# Altium schematic symbol library jlcpcb_2025_04_capacitors_extended_1206.schlib: 2503 symbols (part 12 of 14) (continued)
## HGC1206R5476M160NSPJ
designator C?  Capacitance: 47uF  (hidden comment: *)
Capacitor, Ceramic (MLCC), 47uF, ±20%, 16V, X5R, ±20%, SMD 1206; Manufacturer: Chinocera; Manufacturer Part Number: HGC1206R5476M160NSPJ; Package Size: 1206; JLCPCB Basic Part: No; JLCPCB Part Number: C7472975; Supplier 1: LCSC; Category: Capacitors - MLCC; Supplier Part Number 1: C7472975; Tolerance: ±20%; Voltage Rating: 16V; Temperature Coefficient: X5R; RoHS: Yes; ComponentLink1Description: Datasheet; ComponentLink1URL: https://wmsc.lcsc.com/wmsc/upload/file/pdf/v2/lcsc/2403201122_Chinocera-HGC1206R5476M160NSPJ_C7472975.pdf; ComponentLink2Description: JLCPCB Part URL; ComponentLink2URL: https://jlcpcb.com/partdetail/C7472975; ComponentLink3Description: LCSC Part URL; ComponentLink3URL: https://lcsc.com/product-detail/Multilayer-Ceramic-Capacitors-MLCC---SMD-SMT_Chinocera-Chinocera-HGC1206R5476M160NSPJ_C7472975.html
footprint CAP-1206 (1206 (3216M) Capacitor)
pins: 1, 2

## HGC1206R7333K500NTHJ
designator C?  Capacitance: 33nF  (hidden comment: *)
Capacitor, Ceramic (MLCC), 33nF, 50V, X7R, SMD 1206; Manufacturer: Chinocera; Manufacturer Part Number: HGC1206R7333K500NTHJ; Package Size: 1206; JLCPCB Basic Part: No; JLCPCB Part Number: C5186847; Supplier 1: LCSC; Category: Capacitors - MLCC; Supplier Part Number 1: C5186847; Voltage Rating: 50V; Temperature Coefficient: X7R; RoHS: Yes; ComponentLink1Description: Datasheet; ComponentLink1URL: https://wmsc.lcsc.com/wmsc/upload/file/pdf/v2/lcsc/2403201121_Chinocera-HGC1206R7333K500NTHJ_C5186847.pdf; ComponentLink2Description: JLCPCB Part URL; ComponentLink2URL: https://jlcpcb.com/partdetail/C5186847; ComponentLink3Description: LCSC Part URL; ComponentLink3URL: https://lcsc.com/product-detail/Multilayer-Ceramic-Capacitors-MLCC---SMD-SMT_Chinocera-Chinocera-HGC1206R7333K500NTHJ_C5186847.html
footprint CAP-1206 (1206 (3216M) Capacitor)
pins: 1, 2

## HGC1206R7473K500NTHJ
designator C?  Capacitance: 47nF  (hidden comment: *)
Capacitor, Ceramic (MLCC), 47nF, 50V, X7R, SMD 1206; Manufacturer: Chinocera; Manufacturer Part Number: HGC1206R7473K500NTHJ; Package Size: 1206; JLCPCB Basic Part: No; JLCPCB Part Number: C5186854; Supplier 1: LCSC; Category: Capacitors - MLCC; Supplier Part Number 1: C5186854; Voltage Rating: 50V; Temperature Coefficient: X7R; RoHS: Yes; ComponentLink1Description: Datasheet; ComponentLink1URL: https://wmsc.lcsc.com/wmsc/upload/file/pdf/v2/lcsc/2403201121_Chinocera-HGC1206R7473K500NTHJ_C5186854.pdf; ComponentLink2Description: JLCPCB Part URL; ComponentLink2URL: https://jlcpcb.com/partdetail/C5186854; ComponentLink3Description: LCSC Part URL; ComponentLink3URL: https://lcsc.com/product-detail/Multilayer-Ceramic-Capacitors-MLCC---SMD-SMT_Chinocera-Chinocera-HGC1206R7473K500NTHJ_C5186854.html
footprint CAP-1206 (1206 (3216M) Capacitor)
pins: 1, 2

## HHV1206G0101J102NSJJ
designator C?  Capacitance: 100pF  (hidden comment: *)
Capacitor, Ceramic (MLCC), 100pF, ±5%, 1kV, C0G, ±5%, SMD 1206; Manufacturer: Chinocera; Manufacturer Part Number: HHV1206G0101J102NSJJ; Package Size: 1206; JLCPCB Basic Part: No; JLCPCB Part Number: C465170; Supplier 1: LCSC; Category: Capacitors - MLCC; Supplier Part Number 1: C465170; Tolerance: ±5%; Voltage Rating: 1kV; Temperature Coefficient: C0G; RoHS: Yes; ComponentLink1Description: Datasheet; ComponentLink1URL: https://wmsc.lcsc.com/wmsc/upload/file/pdf/v2/lcsc/2403201120_Chinocera-HHV1206G0101J102NSJJ_C465170.pdf; ComponentLink2Description: JLCPCB Part URL; ComponentLink2URL: https://jlcpcb.com/partdetail/C465170; ComponentLink3Description: LCSC Part URL; ComponentLink3URL: https://lcsc.com/product-detail/Multilayer-Ceramic-Capacitors-MLCC---SMD-SMT_Chinocera-Chinocera-HHV1206G0101J102NSJJ_C465170.html
footprint CAP-1206 (1206 (3216M) Capacitor)
pins: 1, 2

## HHV1206G0330J102NSJJ
designator C?  Capacitance: 33pF  (hidden comment: *)
Capacitor, Ceramic (MLCC), 33pF, ±5%, 1kV, C0G, ±5%, SMD 1206; Manufacturer: Chinocera; Manufacturer Part Number: HHV1206G0330J102NSJJ; Package Size: 1206; JLCPCB Basic Part: No; JLCPCB Part Number: C571053; Supplier 1: LCSC; Category: Capacitors - MLCC; Supplier Part Number 1: C571053; Tolerance: ±5%; Voltage Rating: 1kV; Temperature Coefficient: C0G; RoHS: Yes; ComponentLink1Description: Datasheet; ComponentLink1URL: https://wmsc.lcsc.com/wmsc/upload/file/pdf/v2/lcsc/2403201121_Chinocera-HHV1206G0330J102NSJJ_C571053.pdf; ComponentLink2Description: JLCPCB Part URL; ComponentLink2URL: https://jlcpcb.com/partdetail/C571053; ComponentLink3Description: LCSC Part URL; ComponentLink3URL: https://lcsc.com/product-detail/Multilayer-Ceramic-Capacitors-MLCC---SMD-SMT_Chinocera-Chinocera-HHV1206G0330J102NSJJ_C571053.html
footprint CAP-1206 (1206 (3216M) Capacitor)
pins: 1, 2

## HHV1206G0330J102NSLJ
designator C?  Capacitance: 33pF  (hidden comment: *)
Capacitor, Ceramic (MLCC), 33pF, ±5%, 1kV, C0G, ±5%, SMD 1206; Manufacturer: Chinocera; Manufacturer Part Number: HHV1206G0330J102NSLJ; Package Size: 1206; JLCPCB Basic Part: No; JLCPCB Part Number: C465171; Supplier 1: LCSC; Category: Capacitors - MLCC; Supplier Part Number 1: C465171; Tolerance: ±5%; Voltage Rating: 1kV; Temperature Coefficient: C0G; RoHS: Yes; ComponentLink1Description: Datasheet; ComponentLink1URL: https://wmsc.lcsc.com/wmsc/upload/file/pdf/v2/lcsc/2403201120_Chinocera-HHV1206G0330J102NSLJ_C465171.pdf; ComponentLink2Description: JLCPCB Part URL; ComponentLink2URL: https://jlcpcb.com/partdetail/C465171; ComponentLink3Description: LCSC Part URL; ComponentLink3URL: https://lcsc.com/product-detail/Multilayer-Ceramic-Capacitors-MLCC---SMD-SMT_Chinocera-Chinocera-HHV1206G0330J102NSLJ_C465171.html
footprint CAP-1206 (1206 (3216M) Capacitor)
pins: 1, 2

## HHV1206G0470J102NSJJ
designator C?  Capacitance: 47pF  (hidden comment: *)
Capacitor, Ceramic (MLCC), 47pF, ±5%, 1kV, C0G, ±5%, SMD 1206; Manufacturer: Chinocera; Manufacturer Part Number: HHV1206G0470J102NSJJ; Package Size: 1206; JLCPCB Basic Part: No; JLCPCB Part Number: C571054; Supplier 1: LCSC; Category: Capacitors - MLCC; Supplier Part Number 1: C571054; Tolerance: ±5%; Voltage Rating: 1kV; Temperature Coefficient: C0G; RoHS: Yes; ComponentLink1Description: Datasheet; ComponentLink1URL: https://wmsc.lcsc.com/wmsc/upload/file/pdf/v2/lcsc/2403201121_Chinocera-HHV1206G0470J102NSJJ_C571054.pdf; ComponentLink2Description: JLCPCB Part URL; ComponentLink2URL: https://jlcpcb.com/partdetail/C571054; ComponentLink3Description: LCSC Part URL; ComponentLink3URL: https://lcsc.com/product-detail/Multilayer-Ceramic-Capacitors-MLCC---SMD-SMT_Chinocera-Chinocera-HHV1206G0470J102NSJJ_C571054.html
footprint CAP-1206 (1206 (3216M) Capacitor)
pins: 1, 2

## HHV1206R7102K102NSLJ
designator C?  Capacitance: 1nF  (hidden comment: *)
Capacitor, Ceramic (MLCC), 1nF, ±10%, 1kV, X7R, ±10%, SMD 1206; Manufacturer: Chinocera; Manufacturer Part Number: HHV1206R7102K102NSLJ; Package Size: 1206; JLCPCB Basic Part: No; JLCPCB Part Number: C571055; Supplier 1: LCSC; Category: Capacitors - MLCC; Supplier Part Number 1: C571055; Tolerance: ±10%; Voltage Rating: 1kV; Temperature Coefficient: X7R; RoHS: Yes; ComponentLink1Description: Datasheet; ComponentLink1URL: https://wmsc.lcsc.com/wmsc/upload/file/pdf/v2/lcsc/2403201121_Chinocera-HHV1206R7102K102NSLJ_C571055.pdf; ComponentLink2Description: JLCPCB Part URL; ComponentLink2URL: https://jlcpcb.com/partdetail/C571055; ComponentLink3Description: LCSC Part URL; ComponentLink3URL: https://lcsc.com/product-detail/Multilayer-Ceramic-Capacitors-MLCC---SMD-SMT_Chinocera-Chinocera-HHV1206R7102K102NSLJ_C571055.html
footprint CAP-1206 (1206 (3216M) Capacitor)
pins: 1, 2

## HHV1206R7103K201NTHJ
designator C?  Capacitance: 10nF  (hidden comment: *)
Capacitor, Ceramic (MLCC), 10nF, ±10%, 200V, X7R, ±10%, SMD 1206; Manufacturer: Chinocera; Manufacturer Part Number: HHV1206R7103K201NTHJ; Package Size: 1206; JLCPCB Basic Part: No; JLCPCB Part Number: C5186826; Supplier 1: LCSC; Category: Capacitors - MLCC; Supplier Part Number 1: C5186826; Tolerance: ±10%; Voltage Rating: 200V; Temperature Coefficient: X7R; RoHS: Yes; ComponentLink1Description: Datasheet; ComponentLink1URL: https://wmsc.lcsc.com/wmsc/upload/file/pdf/v2/lcsc/2403201121_Chinocera-HHV1206R7103K201NTHJ_C5186826.pdf; ComponentLink2Description: JLCPCB Part URL; ComponentLink2URL: https://jlcpcb.com/partdetail/C5186826; ComponentLink3Description: LCSC Part URL; ComponentLink3URL: https://lcsc.com/product-detail/Multilayer-Ceramic-Capacitors-MLCC---SMD-SMT_Chinocera-Chinocera-HHV1206R7103K201NTHJ_C5186826.html
footprint CAP-1206 (1206 (3216M) Capacitor)
pins: 1, 2

## HHV1206R7122K202NSLJ
designator C?  Capacitance: 1.2nF  (hidden comment: *)
Capacitor, Ceramic (MLCC), 1.2nF, ±10%, 2kV, X7R, ±10%, SMD 1206; Manufacturer: Chinocera; Manufacturer Part Number: HHV1206R7122K202NSLJ; Package Size: 1206; JLCPCB Basic Part: No; JLCPCB Part Number: C571057; Supplier 1: LCSC; Category: Capacitors - MLCC; Supplier Part Number 1: C571057; Tolerance: ±10%; Voltage Rating: 2kV; Temperature Coefficient: X7R; RoHS: Yes; ComponentLink1Description: Datasheet; ComponentLink1URL: https://wmsc.lcsc.com/wmsc/upload/file/pdf/v2/lcsc/2403201121_Chinocera-HHV1206R7122K202NSLJ_C571057.pdf; ComponentLink2Description: JLCPCB Part URL; ComponentLink2URL: https://jlcpcb.com/partdetail/C571057; ComponentLink3Description: LCSC Part URL; ComponentLink3URL: https://lcsc.com/product-detail/Multilayer-Ceramic-Capacitors-MLCC---SMD-SMT_Chinocera-Chinocera-HHV1206R7122K202NSLJ_C571057.html
footprint CAP-1206 (1206 (3216M) Capacitor)
pins: 1, 2

## HHV1206R7221K102NSLJ
designator C?  Capacitance: 220pF  (hidden comment: *)
Capacitor, Ceramic (MLCC), 220pF, ±10%, 1kV, X7R, ±10%, SMD 1206; Manufacturer: Chinocera; Manufacturer Part Number: HHV1206R7221K102NSLJ; Package Size: 1206; JLCPCB Basic Part: No; JLCPCB Part Number: C571058; Supplier 1: LCSC; Category: Capacitors - MLCC; Supplier Part Number 1: C571058; Tolerance: ±10%; Voltage Rating: 1kV; Temperature Coefficient: X7R; RoHS: Yes; ComponentLink1Description: Datasheet; ComponentLink1URL: https://wmsc.lcsc.com/wmsc/upload/file/pdf/v2/lcsc/2403201121_Chinocera-HHV1206R7221K102NSLJ_C571058.pdf; ComponentLink2Description: JLCPCB Part URL; ComponentLink2URL: https://jlcpcb.com/partdetail/C571058; ComponentLink3Description: LCSC Part URL; ComponentLink3URL: https://lcsc.com/product-detail/Multilayer-Ceramic-Capacitors-MLCC---SMD-SMT_Chinocera-Chinocera-HHV1206R7221K102NSLJ_C571058.html
footprint CAP-1206 (1206 (3216M) Capacitor)
pins: 1, 2

## HHV1206R7222K102NSLJ
designator C?  Capacitance: 2.2nF  (hidden comment: *)
Capacitor, Ceramic (MLCC), 2.2nF, ±10%, 1kV, X7R, ±10%, SMD 1206; Manufacturer: Chinocera; Manufacturer Part Number: HHV1206R7222K102NSLJ; Package Size: 1206; JLCPCB Basic Part: No; JLCPCB Part Number: C571059; Supplier 1: LCSC; Category: Capacitors - MLCC; Supplier Part Number 1: C571059; Tolerance: ±10%; Voltage Rating: 1kV; Temperature Coefficient: X7R; RoHS: Yes; ComponentLink1Description: Datasheet; ComponentLink1URL: https://wmsc.lcsc.com/wmsc/upload/file/pdf/v2/lcsc/2403201121_Chinocera-HHV1206R7222K102NSLJ_C571059.pdf; ComponentLink2Description: JLCPCB Part URL; ComponentLink2URL: https://jlcpcb.com/partdetail/C571059; ComponentLink3Description: LCSC Part URL; ComponentLink3URL: https://lcsc.com/product-detail/Multilayer-Ceramic-Capacitors-MLCC---SMD-SMT_Chinocera-Chinocera-HHV1206R7222K102NSLJ_C571059.html
footprint CAP-1206 (1206 (3216M) Capacitor)
pins: 1, 2

## HHV1206R7223K251NTHJ
designator C?  Capacitance: 22nF  (hidden comment: *)
Capacitor, Ceramic (MLCC), 22nF, 250V, X7R, SMD 1206; Manufacturer: Chinocera; Manufacturer Part Number: HHV1206R7223K251NTHJ; Package Size: 1206; JLCPCB Basic Part: No; JLCPCB Part Number: C5186840; Supplier 1: LCSC; Category: Capacitors - MLCC; Supplier Part Number 1: C5186840; Voltage Rating: 250V; Temperature Coefficient: X7R; RoHS: Yes; ComponentLink1Description: Datasheet; ComponentLink1URL: https://wmsc.lcsc.com/wmsc/upload/file/pdf/v2/lcsc/2403201121_Chinocera-HHV1206R7223K251NTHJ_C5186840.pdf; ComponentLink2Description: JLCPCB Part URL; ComponentLink2URL: https://jlcpcb.com/partdetail/C5186840; ComponentLink3Description: LCSC Part URL; ComponentLink3URL: https://lcsc.com/product-detail/Multilayer-Ceramic-Capacitors-MLCC---SMD-SMT_Chinocera-Chinocera-HHV1206R7223K251NTHJ_C5186840.html
footprint CAP-1206 (1206 (3216M) Capacitor)
pins: 1, 2

## HHV1206R7331K102NSLJ
designator C?  Capacitance: 330pF  (hidden comment: *)
Capacitor, Ceramic (MLCC), 330pF, ±10%, 1kV, X7R, ±10%, SMD 1206; Manufacturer: Chinocera; Manufacturer Part Number: HHV1206R7331K102NSLJ; Package Size: 1206; JLCPCB Basic Part: No; JLCPCB Part Number: C571060; Supplier 1: LCSC; Category: Capacitors - MLCC; Supplier Part Number 1: C571060; Tolerance: ±10%; Voltage Rating: 1kV; Temperature Coefficient: X7R; RoHS: Yes; ComponentLink1Description: Datasheet; ComponentLink1URL: https://wmsc.lcsc.com/wmsc/upload/file/pdf/v2/lcsc/2403201121_Chinocera-HHV1206R7331K102NSLJ_C571060.pdf; ComponentLink2Description: JLCPCB Part URL; ComponentLink2URL: https://jlcpcb.com/partdetail/C571060; ComponentLink3Description: LCSC Part URL; ComponentLink3URL: https://lcsc.com/product-detail/Multilayer-Ceramic-Capacitors-MLCC---SMD-SMT_Chinocera-Chinocera-HHV1206R7331K102NSLJ_C571060.html
footprint CAP-1206 (1206 (3216M) Capacitor)
pins: 1, 2

## HHV1206R7332K102NSLJ
designator C?  Capacitance: 3.3nF  (hidden comment: *)
Capacitor, Ceramic (MLCC), 3.3nF, ±10%, 1kV, X7R, ±10%, SMD 1206; Manufacturer: Chinocera; Manufacturer Part Number: HHV1206R7332K102NSLJ; Package Size: 1206; JLCPCB Basic Part: No; JLCPCB Part Number: C571061; Supplier 1: LCSC; Category: Capacitors - MLCC; Supplier Part Number 1: C571061; Tolerance: ±10%; Voltage Rating: 1kV; Temperature Coefficient: X7R; RoHS: Yes; ComponentLink1Description: Datasheet; ComponentLink1URL: https://wmsc.lcsc.com/wmsc/upload/file/pdf/v2/lcsc/2403201121_Chinocera-HHV1206R7332K102NSLJ_C571061.pdf; ComponentLink2Description: JLCPCB Part URL; ComponentLink2URL: https://jlcpcb.com/partdetail/C571061; ComponentLink3Description: LCSC Part URL; ComponentLink3URL: https://lcsc.com/product-detail/Multilayer-Ceramic-Capacitors-MLCC---SMD-SMT_Chinocera-Chinocera-HHV1206R7332K102NSLJ_C571061.html
footprint CAP-1206 (1206 (3216M) Capacitor)
pins: 1, 2

## HHV1206R7471K102NSLJ
designator C?  Capacitance: 470pF  (hidden comment: *)
Capacitor, Ceramic (MLCC), 470pF, ±10%, 1kV, X7R, ±10%, SMD 1206; Manufacturer: Chinocera; Manufacturer Part Number: HHV1206R7471K102NSLJ; Package Size: 1206; JLCPCB Basic Part: No; JLCPCB Part Number: C571062; Supplier 1: LCSC; Category: Capacitors - MLCC; Supplier Part Number 1: C571062; Tolerance: ±10%; Voltage Rating: 1kV; Temperature Coefficient: X7R; RoHS: Yes; ComponentLink1Description: Datasheet; ComponentLink1URL: https://wmsc.lcsc.com/wmsc/upload/file/pdf/v2/lcsc/2403201121_Chinocera-HHV1206R7471K102NSLJ_C571062.pdf; ComponentLink2Description: JLCPCB Part URL; ComponentLink2URL: https://jlcpcb.com/partdetail/C571062; ComponentLink3Description: LCSC Part URL; ComponentLink3URL: https://lcsc.com/product-detail/Multilayer-Ceramic-Capacitors-MLCC---SMD-SMT_Chinocera-Chinocera-HHV1206R7471K102NSLJ_C571062.html
footprint CAP-1206 (1206 (3216M) Capacitor)
pins: 1, 2

## HHV1206R7472K102NSLJ
designator C?  Capacitance: 4.7nF  (hidden comment: *)
Capacitor, Ceramic (MLCC), 4.7nF, ±10%, 1kV, X7R, ±10%, SMD 1206; Manufacturer: Chinocera; Manufacturer Part Number: HHV1206R7472K102NSLJ; Package Size: 1206; JLCPCB Basic Part: No; JLCPCB Part Number: C571063; Supplier 1: LCSC; Category: Capacitors - MLCC; Supplier Part Number 1: C571063; Tolerance: ±10%; Voltage Rating: 1kV; Temperature Coefficient: X7R; RoHS: Yes; ComponentLink1Description: Datasheet; ComponentLink1URL: https://wmsc.lcsc.com/wmsc/upload/file/pdf/v2/lcsc/2403201121_Chinocera-HHV1206R7472K102NSLJ_C571063.pdf; ComponentLink2Description: JLCPCB Part URL; ComponentLink2URL: https://jlcpcb.com/partdetail/C571063; ComponentLink3Description: LCSC Part URL; ComponentLink3URL: https://lcsc.com/product-detail/Multilayer-Ceramic-Capacitors-MLCC---SMD-SMT_Chinocera-Chinocera-HHV1206R7472K102NSLJ_C571063.html
footprint CAP-1206 (1206 (3216M) Capacitor)
pins: 1, 2

## HMJ316BC7225KLHTE
designator C?  Capacitance: 2.2uF  (hidden comment: *)
Capacitor, Ceramic (MLCC), 2.2uF, ±10%, 100V, X7S, ±10%, SMD 1206; Manufacturer: Taiyo Yuden; Manufacturer Part Number: HMJ316BC7225KLHTE; Package Size: 1206; JLCPCB Basic Part: No; JLCPCB Part Number: C412613; Supplier 1: LCSC; Category: Capacitors - MLCC; Supplier Part Number 1: C412613; Tolerance: ±10%; Voltage Rating: 100V; Temperature Coefficient: X7S; RoHS: Yes; ComponentLink1Description: Datasheet; ComponentLink1URL: https://wmsc.lcsc.com/wmsc/upload/file/pdf/v2/lcsc/2211282230_Taiyo-Yuden-HMJ316BC7225KLHTE_C412613.pdf; ComponentLink2Description: JLCPCB Part URL; ComponentLink2URL: https://jlcpcb.com/partdetail/C412613; ComponentLink3Description: LCSC Part URL; ComponentLink3URL: https://lcsc.com/product-detail/Multilayer-Ceramic-Capacitors-MLCC---SMD-SMT_Taiyo-Yuden-Taiyo-Yuden-HMJ316BC7225KLHTE_C412613.html
footprint CAP-1206 (1206 (3216M) Capacitor)
pins: 1, 2

## HMK316AC7225KL-TE
designator C?  Capacitance: 2.2uF  (hidden comment: *)
Capacitor, Ceramic (MLCC), 2.2uF, ±10%, 100V, X7S, ±10%, SMD 1206; Manufacturer: Taiyo Yuden; Manufacturer Part Number: HMK316AC7225KL-TE; Package Size: 1206; JLCPCB Basic Part: No; JLCPCB Part Number: C783005; Supplier 1: LCSC; Category: Capacitors - MLCC; Supplier Part Number 1: C783005; Tolerance: ±10%; Voltage Rating: 100V; Temperature Coefficient: X7S; RoHS: Yes; ComponentLink1Description: Datasheet; ComponentLink1URL: https://wmsc.lcsc.com/wmsc/upload/file/pdf/v2/lcsc/2211282200_Taiyo-Yuden-HMK316AC7225KL-TE_C783005.pdf; ComponentLink2Description: JLCPCB Part URL; ComponentLink2URL: https://jlcpcb.com/partdetail/C783005; ComponentLink3Description: LCSC Part URL; ComponentLink3URL: https://lcsc.com/product-detail/Multilayer-Ceramic-Capacitors-MLCC---SMD-SMT_Taiyo-Yuden-Taiyo-Yuden-HMK316AC7225KL-TE_C783005.html
footprint CAP-1206 (1206 (3216M) Capacitor)
pins: 1, 2

## HMK316AC7225KLHTE
designator C?  Capacitance: 2.2uF  (hidden comment: *)
Capacitor, Ceramic (MLCC), 2.2uF, ±10%, 100V, X7S, ±10%, SMD 1206; Manufacturer: Taiyo Yuden; Manufacturer Part Number: HMK316AC7225KLHTE; Package Size: 1206; JLCPCB Basic Part: No; JLCPCB Part Number: C650969; Supplier 1: LCSC; Category: Capacitors - MLCC; Supplier Part Number 1: C650969; Tolerance: ±10%; Voltage Rating: 100V; Temperature Coefficient: X7S; RoHS: Yes; ComponentLink1Description: Datasheet; ComponentLink1URL: https://wmsc.lcsc.com/wmsc/upload/file/pdf/v2/lcsc/2211282200_Taiyo-Yuden-HMK316AC7225KLHTE_C650969.pdf; ComponentLink2Description: JLCPCB Part URL; ComponentLink2URL: https://jlcpcb.com/partdetail/C650969; ComponentLink3Description: LCSC Part URL; ComponentLink3URL: https://lcsc.com/product-detail/Multilayer-Ceramic-Capacitors-MLCC---SMD-SMT_Taiyo-Yuden-Taiyo-Yuden-HMK316AC7225KLHTE_C650969.html
footprint CAP-1206 (1206 (3216M) Capacitor)
pins: 1, 2

## HMK316B7104KLHT
designator C?  Capacitance: 100nF  (hidden comment: *)
Capacitor, Ceramic (MLCC), 100nF, ±10%, 100V, X7R, ±10%, SMD 1206; Manufacturer: Taiyo Yuden; Manufacturer Part Number: HMK316B7104KLHT; Package Size: 1206; JLCPCB Basic Part: No; JLCPCB Part Number: C650999; Supplier 1: LCSC; Category: Capacitors - MLCC; Supplier Part Number 1: C650999; Tolerance: ±10%; Voltage Rating: 100V; Temperature Coefficient: X7R; RoHS: Yes; ComponentLink1Description: Datasheet; ComponentLink1URL: https://wmsc.lcsc.com/wmsc/upload/file/pdf/v2/lcsc/2211282200_Taiyo-Yuden-HMK316B7104KLHT_C650999.pdf; ComponentLink2Description: JLCPCB Part URL; ComponentLink2URL: https://jlcpcb.com/partdetail/C650999; ComponentLink3Description: LCSC Part URL; ComponentLink3URL: https://lcsc.com/product-detail/Multilayer-Ceramic-Capacitors-MLCC---SMD-SMT_Taiyo-Yuden-Taiyo-Yuden-HMK316B7104KLHT_C650999.html
footprint CAP-1206 (1206 (3216M) Capacitor)
pins: 1, 2

## HMK316B7105KL-T
designator C?  Capacitance: 1uF  (hidden comment: *)
Capacitor, Ceramic (MLCC), 1uF, ±10%, 100V, X7R, ±10%, SMD 1206; Manufacturer: Taiyo Yuden; Manufacturer Part Number: HMK316B7105KL-T; Package Size: 1206; JLCPCB Basic Part: No; JLCPCB Part Number: C385979; Supplier 1: LCSC; Category: Capacitors - MLCC; Supplier Part Number 1: C385979; Tolerance: ±10%; Voltage Rating: 100V; Temperature Coefficient: X7R; RoHS: Yes; ComponentLink1Description: Datasheet; ComponentLink1URL: https://wmsc.lcsc.com/wmsc/upload/file/pdf/v2/lcsc/2211282230_Taiyo-Yuden-HMK316B7105KL-T_C385979.pdf; ComponentLink2Description: JLCPCB Part URL; ComponentLink2URL: https://jlcpcb.com/partdetail/C385979; ComponentLink3Description: LCSC Part URL; ComponentLink3URL: https://lcsc.com/product-detail/Multilayer-Ceramic-Capacitors-MLCC---SMD-SMT_Taiyo-Yuden-Taiyo-Yuden-HMK316B7105KL-T_C385979.html
footprint CAP-1206 (1206 (3216M) Capacitor)
pins: 1, 2

## HMK316B7105KLHT
designator C?  Capacitance: 1uF  (hidden comment: *)
Capacitor, Ceramic (MLCC), 1uF, ±10%, 100V, X7R, ±10%, SMD 1206; Manufacturer: Taiyo Yuden; Manufacturer Part Number: HMK316B7105KLHT; Package Size: 1206; JLCPCB Basic Part: No; JLCPCB Part Number: C385978; Supplier 1: LCSC; Category: Capacitors - MLCC; Supplier Part Number 1: C385978; Tolerance: ±10%; Voltage Rating: 100V; Temperature Coefficient: X7R; RoHS: Yes; ComponentLink1Description: Datasheet; ComponentLink1URL: https://wmsc.lcsc.com/wmsc/upload/file/pdf/v2/lcsc/2211282230_Taiyo-Yuden-HMK316B7105KLHT_C385978.pdf; ComponentLink2Description: JLCPCB Part URL; ComponentLink2URL: https://jlcpcb.com/partdetail/C385978; ComponentLink3Description: LCSC Part URL; ComponentLink3URL: https://lcsc.com/product-detail/Multilayer-Ceramic-Capacitors-MLCC---SMD-SMT_Taiyo-Yuden-Taiyo-Yuden-HMK316B7105KLHT_C385978.html
footprint CAP-1206 (1206 (3216M) Capacitor)
pins: 1, 2

## HMK316BJ105KL-T
designator C?  Capacitance: 1uF  (hidden comment: *)
Capacitor, Ceramic (MLCC), 1uF, ±10%, 100V, X5R, ±10%, SMD 1206; Manufacturer: Taiyo Yuden; Manufacturer Part Number: HMK316BJ105KL-T; Package Size: 1206; JLCPCB Basic Part: No; JLCPCB Part Number: C524988; Supplier 1: LCSC; Category: Capacitors - MLCC; Supplier Part Number 1: C524988; Tolerance: ±10%; Voltage Rating: 100V; Temperature Coefficient: X5R; RoHS: Yes; ComponentLink1Description: Datasheet; ComponentLink1URL: https://wmsc.lcsc.com/wmsc/upload/file/pdf/v2/lcsc/2304140030_Taiyo-Yuden-HMK316BJ105KL-T_C524988.pdf; ComponentLink2Description: JLCPCB Part URL; ComponentLink2URL: https://jlcpcb.com/partdetail/C524988; ComponentLink3Description: LCSC Part URL; ComponentLink3URL: https://lcsc.com/product-detail/Multilayer-Ceramic-Capacitors-MLCC---SMD-SMT_Taiyo-Yuden-Taiyo-Yuden-HMK316BJ105KL-T_C524988.html
footprint CAP-1206 (1206 (3216M) Capacitor)
pins: 1, 2

## HV1206X7R101K102NT
designator C?  Capacitance: 100pF  (hidden comment: *)
Capacitor, Ceramic (MLCC), 100pF, ±10%, 1kV, ±10%, SMD 1206; Manufacturer: AIDE; Manufacturer Part Number: HV1206X7R101K102NT; Package Size: 1206; JLCPCB Basic Part: No; JLCPCB Part Number: C2691770; Supplier 1: LCSC; Category: Capacitors - MLCC; Supplier Part Number 1: C2691770; Tolerance: ±10%; Voltage Rating: 1kV; RoHS: Yes; ComponentLink1Description: Datasheet; ComponentLink1URL: https://datasheet.lcsc.com/lcsc/2103301638_AIDE-HV1206X7R101K102NT_C2691770.pdf; ComponentLink2Description: JLCPCB Part URL; ComponentLink2URL: https://jlcpcb.com/partdetail/C2691770; ComponentLink3Description: LCSC Part URL; ComponentLink3URL: https://lcsc.com/product-detail/Multilayer-Ceramic-Capacitors-MLCC---SMD-SMT_AIDE-AIDE-HV1206X7R101K102NT_C2691770.html
footprint CAP-1206 (1206 (3216M) Capacitor)
pins: 1, 2

## HV1206X7R102K202NT
designator C?  Capacitance: 1nF  (hidden comment: *)
Capacitor, Ceramic (MLCC), 1nF, 2kV, SMD 1206; Manufacturer: AIDE; Manufacturer Part Number: HV1206X7R102K202NT; Package Size: 1206; JLCPCB Basic Part: No; JLCPCB Part Number: C2691773; Supplier 1: LCSC; Category: Capacitors - MLCC; Supplier Part Number 1: C2691773; Voltage Rating: 2kV; RoHS: Yes; ComponentLink1Description: Datasheet; ComponentLink1URL: https://datasheet.lcsc.com/lcsc/2103301639_AIDE-HV1206X7R102K202NT_C2691773.pdf; ComponentLink2Description: JLCPCB Part URL; ComponentLink2URL: https://jlcpcb.com/partdetail/C2691773; ComponentLink3Description: LCSC Part URL; ComponentLink3URL: https://lcsc.com/product-detail/Multilayer-Ceramic-Capacitors-MLCC---SMD-SMT_AIDE-AIDE-HV1206X7R102K202NT_C2691773.html
footprint CAP-1206 (1206 (3216M) Capacitor)
pins: 1, 2

## HV1206X7R332K202NT
designator C?  Capacitance: 3.3nF  (hidden comment: *)
Capacitor, Ceramic (MLCC), 3.3nF, ±10%, 2kV, ±10%, SMD 1206; Manufacturer: AIDE; Manufacturer Part Number: HV1206X7R332K202NT; Package Size: 1206; JLCPCB Basic Part: No; JLCPCB Part Number: C2691793; Supplier 1: LCSC; Category: Capacitors - MLCC; Supplier Part Number 1: C2691793; Tolerance: ±10%; Voltage Rating: 2kV; RoHS: Yes; ComponentLink1Description: Datasheet; ComponentLink1URL: https://datasheet.lcsc.com/lcsc/2103301639_AIDE-HV1206X7R332K202NT_C2691793.pdf; ComponentLink2Description: JLCPCB Part URL; ComponentLink2URL: https://jlcpcb.com/partdetail/C2691793; ComponentLink3Description: LCSC Part URL; ComponentLink3URL: https://lcsc.com/product-detail/Multilayer-Ceramic-Capacitors-MLCC---SMD-SMT_AIDE-AIDE-HV1206X7R332K202NT_C2691793.html
footprint CAP-1206 (1206 (3216M) Capacitor)
pins: 1, 2

## JMK316AB7106KLHT
designator C?  Capacitance: 10uF  (hidden comment: *)
Capacitor, Ceramic (MLCC), 10uF, ±10%, 6.3V, ±10%, SMD 1206; Manufacturer: Taiyo Yuden; Manufacturer Part Number: JMK316AB7106KLHT; Package Size: 1206; JLCPCB Basic Part: No; JLCPCB Part Number: C454108; Supplier 1: LCSC; Category: Capacitors - MLCC; Supplier Part Number 1: C454108; Tolerance: ±10%; Voltage Rating: 6.3V; RoHS: Yes; ComponentLink1Description: Datasheet; ComponentLink1URL: https://wmsc.lcsc.com/wmsc/upload/file/pdf/v2/lcsc/2304140030_Taiyo-Yuden-JMK316AB7106KLHT_C454108.pdf; ComponentLink2Description: JLCPCB Part URL; ComponentLink2URL: https://jlcpcb.com/partdetail/C454108; ComponentLink3Description: LCSC Part URL; ComponentLink3URL: https://lcsc.com/product-detail/Multilayer-Ceramic-Capacitors-MLCC---SMD-SMT_Taiyo-Yuden-Taiyo-Yuden-JMK316AB7106KLHT_C454108.html
footprint CAP-1206 (1206 (3216M) Capacitor)
pins: 1, 2

## JMK316AB7226KLHT
designator C?  Capacitance: 22uF  (hidden comment: *)
Capacitor, Ceramic (MLCC), 22uF, ±10%, 6.3V, X7R, ±10%, SMD 1206; Manufacturer: Taiyo Yuden; Manufacturer Part Number: JMK316AB7226KLHT; Package Size: 1206; JLCPCB Basic Part: No; JLCPCB Part Number: C268007; Supplier 1: LCSC; Category: Capacitors - MLCC; Supplier Part Number 1: C268007; Tolerance: ±10%; Voltage Rating: 6.3V; Temperature Coefficient: X7R; RoHS: Yes; ComponentLink1Description: Datasheet; ComponentLink1URL: https://wmsc.lcsc.com/wmsc/upload/file/pdf/v2/lcsc/1810201243_Taiyo-Yuden-JMK316AB7226KLHT_C268007.pdf; ComponentLink2Description: JLCPCB Part URL; ComponentLink2URL: https://jlcpcb.com/partdetail/C268007; ComponentLink3Description: LCSC Part URL; ComponentLink3URL: https://lcsc.com/product-detail/Multilayer-Ceramic-Capacitors-MLCC---SMD-SMT_Taiyo-Yuden-Taiyo-Yuden-JMK316AB7226KLHT_C268007.html
footprint CAP-1206 (1206 (3216M) Capacitor)
pins: 1, 2

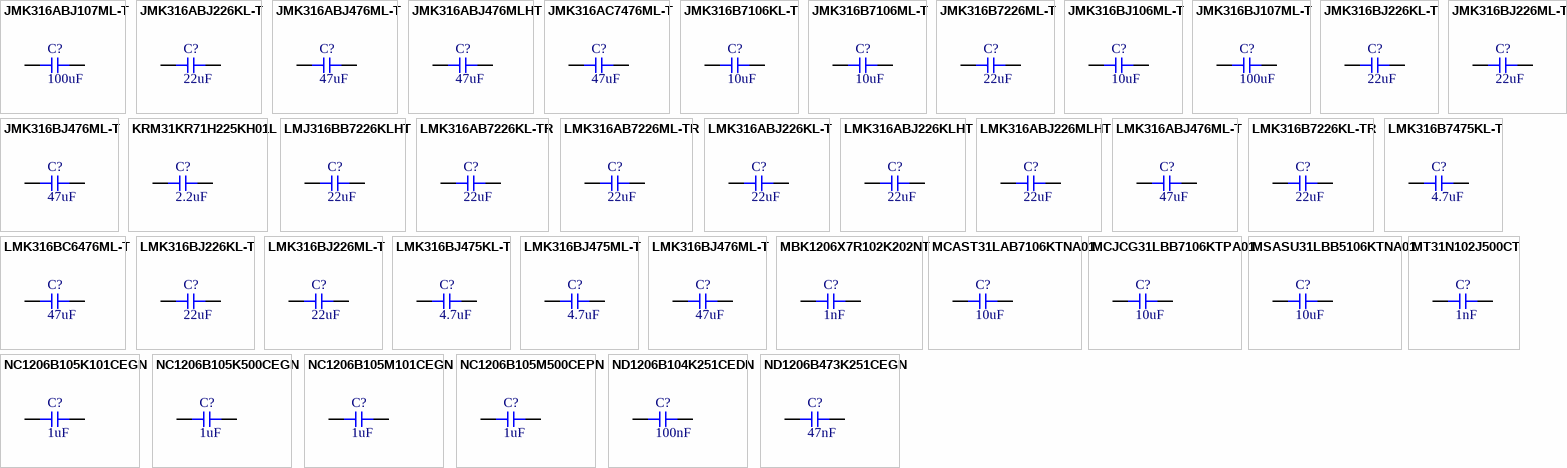
[diagram p52: symbols JMK316ABJ107ML-T to ND1206B473K251CEGN]

## JMK316ABJ107ML-T
designator C?  Capacitance: 100uF  (hidden comment: *)
Capacitor, Ceramic (MLCC), 100uF, ±20%, 6.3V, X5R, ±20%, SMD 1206; Manufacturer: Taiyo Yuden; Manufacturer Part Number: JMK316ABJ107ML-T; Package Size: 1206; JLCPCB Basic Part: No; JLCPCB Part Number: C268006; Supplier 1: LCSC; Category: Capacitors - MLCC; Supplier Part Number 1: C268006; Tolerance: ±20%; Voltage Rating: 6.3V; Temperature Coefficient: X5R; RoHS: Yes; ComponentLink1Description: Datasheet; ComponentLink1URL: https://wmsc.lcsc.com/wmsc/upload/file/pdf/v2/lcsc/1811011224_Taiyo-Yuden-JMK316ABJ107ML-T_C268006.pdf; ComponentLink2Description: JLCPCB Part URL; ComponentLink2URL: https://jlcpcb.com/partdetail/C268006; ComponentLink3Description: LCSC Part URL; ComponentLink3URL: https://lcsc.com/product-detail/Multilayer-Ceramic-Capacitors-MLCC---SMD-SMT_Taiyo-Yuden-Taiyo-Yuden-JMK316ABJ107ML-T_C268006.html
footprint CAP-1206 (1206 (3216M) Capacitor)
pins: 1, 2

## JMK316ABJ226KL-T
designator C?  Capacitance: 22uF  (hidden comment: *)
Capacitor, Ceramic (MLCC), 22uF, ±10%, 6.3V, X5R, ±10%, SMD 1206; Manufacturer: Taiyo Yuden; Manufacturer Part Number: JMK316ABJ226KL-T; Package Size: 1206; JLCPCB Basic Part: No; JLCPCB Part Number: C478848; Supplier 1: LCSC; Category: Capacitors - MLCC; Supplier Part Number 1: C478848; Tolerance: ±10%; Voltage Rating: 6.3V; Temperature Coefficient: X5R; RoHS: Yes; ComponentLink1Description: Datasheet; ComponentLink1URL: https://wmsc.lcsc.com/wmsc/upload/file/pdf/v2/lcsc/2304140030_Taiyo-Yuden-JMK316ABJ226KL-T_C478848.pdf; ComponentLink2Description: JLCPCB Part URL; ComponentLink2URL: https://jlcpcb.com/partdetail/C478848; ComponentLink3Description: LCSC Part URL; ComponentLink3URL: https://lcsc.com/product-detail/Multilayer-Ceramic-Capacitors-MLCC---SMD-SMT_Taiyo-Yuden-Taiyo-Yuden-JMK316ABJ226KL-T_C478848.html
footprint CAP-1206 (1206 (3216M) Capacitor)
pins: 1, 2

## JMK316ABJ476ML-T
designator C?  Capacitance: 47uF  (hidden comment: *)
Capacitor, Ceramic (MLCC), 47uF, ±20%, 6.3V, X5R, ±20%, SMD 1206; Manufacturer: Taiyo Yuden; Manufacturer Part Number: JMK316ABJ476ML-T; Package Size: 1206; JLCPCB Basic Part: No; JLCPCB Part Number: C87163; Supplier 1: LCSC; Category: Capacitors - MLCC; Supplier Part Number 1: C87163; Tolerance: ±20%; Voltage Rating: 6.3V; Temperature Coefficient: X5R; RoHS: Yes; ComponentLink1Description: Datasheet; ComponentLink1URL: https://wmsc.lcsc.com/wmsc/upload/file/pdf/v2/lcsc/2211282300_Taiyo-Yuden-JMK316ABJ476ML-T_C87163.pdf; ComponentLink2Description: JLCPCB Part URL; ComponentLink2URL: https://jlcpcb.com/partdetail/C87163; ComponentLink3Description: LCSC Part URL; ComponentLink3URL: https://lcsc.com/product-detail/Multilayer-Ceramic-Capacitors-MLCC---SMD-SMT_Taiyo-Yuden-Taiyo-Yuden-JMK316ABJ476ML-T_C87163.html
footprint CAP-1206 (1206 (3216M) Capacitor)
pins: 1, 2

## JMK316ABJ476MLHT
designator C?  Capacitance: 47uF  (hidden comment: *)
Capacitor, Ceramic (MLCC), 47uF, ±20%, 6.3V, X5R, ±20%, SMD 1206; Manufacturer: Taiyo Yuden; Manufacturer Part Number: JMK316ABJ476MLHT; Package Size: 1206; JLCPCB Basic Part: No; JLCPCB Part Number: C395218; Supplier 1: LCSC; Category: Capacitors - MLCC; Supplier Part Number 1: C395218; Tolerance: ±20%; Voltage Rating: 6.3V; Temperature Coefficient: X5R; RoHS: Yes; ComponentLink1Description: Datasheet; ComponentLink1URL: https://wmsc.lcsc.com/wmsc/upload/file/pdf/v2/lcsc/1912111437_Taiyo-Yuden-JMK316ABJ476MLHT_C395218.pdf; ComponentLink2Description: JLCPCB Part URL; ComponentLink2URL: https://jlcpcb.com/partdetail/C395218; ComponentLink3Description: LCSC Part URL; ComponentLink3URL: https://lcsc.com/product-detail/Multilayer-Ceramic-Capacitors-MLCC---SMD-SMT_Taiyo-Yuden-Taiyo-Yuden-JMK316ABJ476MLHT_C395218.html
footprint CAP-1206 (1206 (3216M) Capacitor)
pins: 1, 2

## JMK316AC7476ML-T
designator C?  Capacitance: 47uF  (hidden comment: *)
Capacitor, Ceramic (MLCC), 47uF, ±20%, 6.3V, X7S, ±20%, SMD 1206; Manufacturer: Taiyo Yuden; Manufacturer Part Number: JMK316AC7476ML-T; Package Size: 1206; JLCPCB Basic Part: No; JLCPCB Part Number: C2181450; Supplier 1: LCSC; Category: Capacitors - MLCC; Supplier Part Number 1: C2181450; Tolerance: ±20%; Voltage Rating: 6.3V; Temperature Coefficient: X7S; RoHS: Yes; ComponentLink1Description: Datasheet; ComponentLink1URL: https://wmsc.lcsc.com/wmsc/upload/file/pdf/v2/lcsc/2211282000_Taiyo-Yuden-JMK316AC7476ML-T_C2181450.pdf; ComponentLink2Description: JLCPCB Part URL; ComponentLink2URL: https://jlcpcb.com/partdetail/C2181450; ComponentLink3Description: LCSC Part URL; ComponentLink3URL: https://lcsc.com/product-detail/Multilayer-Ceramic-Capacitors-MLCC---SMD-SMT_Taiyo-Yuden-Taiyo-Yuden-JMK316AC7476ML-T_C2181450.html
footprint CAP-1206 (1206 (3216M) Capacitor)
pins: 1, 2

## JMK316B7106KL-T
designator C?  Capacitance: 10uF  (hidden comment: *)
Capacitor, Ceramic (MLCC), 10uF, ±10%, 6.3V, X7R, ±10%, SMD 1206; Manufacturer: Taiyo Yuden; Manufacturer Part Number: JMK316B7106KL-T; Package Size: 1206; JLCPCB Basic Part: No; JLCPCB Part Number: C2167155; Supplier 1: LCSC; Category: Capacitors - MLCC; Supplier Part Number 1: C2167155; Tolerance: ±10%; Voltage Rating: 6.3V; Temperature Coefficient: X7R; RoHS: Yes; ComponentLink1Description: Datasheet; ComponentLink1URL: https://wmsc.lcsc.com/wmsc/upload/file/pdf/v2/lcsc/2211282030_Taiyo-Yuden-JMK316B7106KL-T_C2167155.pdf; ComponentLink2Description: JLCPCB Part URL; ComponentLink2URL: https://jlcpcb.com/partdetail/C2167155; ComponentLink3Description: LCSC Part URL; ComponentLink3URL: https://lcsc.com/product-detail/Multilayer-Ceramic-Capacitors-MLCC---SMD-SMT_Taiyo-Yuden-Taiyo-Yuden-JMK316B7106KL-T_C2167155.html
footprint CAP-1206 (1206 (3216M) Capacitor)
pins: 1, 2

## JMK316B7106ML-T
designator C?  Capacitance: 10uF  (hidden comment: *)
Capacitor, Ceramic (MLCC), 10uF, ±20%, 6.3V, X7R, ±20%, SMD 1206; Manufacturer: Taiyo Yuden; Manufacturer Part Number: JMK316B7106ML-T; Package Size: 1206; JLCPCB Basic Part: No; JLCPCB Part Number: C524989; Supplier 1: LCSC; Category: Capacitors - MLCC; Supplier Part Number 1: C524989; Tolerance: ±20%; Voltage Rating: 6.3V; Temperature Coefficient: X7R; RoHS: Yes; ComponentLink1Description: Datasheet; ComponentLink1URL: https://wmsc.lcsc.com/wmsc/upload/file/pdf/v2/lcsc/2304140030_Taiyo-Yuden-JMK316B7106ML-T_C524989.pdf; ComponentLink2Description: JLCPCB Part URL; ComponentLink2URL: https://jlcpcb.com/partdetail/C524989; ComponentLink3Description: LCSC Part URL; ComponentLink3URL: https://lcsc.com/product-detail/Multilayer-Ceramic-Capacitors-MLCC---SMD-SMT_Taiyo-Yuden-Taiyo-Yuden-JMK316B7106ML-T_C524989.html
footprint CAP-1206 (1206 (3216M) Capacitor)
pins: 1, 2

## JMK316B7226ML-T
designator C?  Capacitance: 22uF  (hidden comment: *)
Capacitor, Ceramic (MLCC), 22uF, ±20%, 6.3V, X7R, ±20%, SMD 1206; Manufacturer: Taiyo Yuden; Manufacturer Part Number: JMK316B7226ML-T; Package Size: 1206; JLCPCB Basic Part: No; JLCPCB Part Number: C2915243; Supplier 1: LCSC; Category: Capacitors - MLCC; Supplier Part Number 1: C2915243; Tolerance: ±20%; Voltage Rating: 6.3V; Temperature Coefficient: X7R; RoHS: Yes; ComponentLink1Description: Datasheet; ComponentLink1URL: https://wmsc.lcsc.com/wmsc/upload/file/pdf/v2/lcsc/2111091130_Taiyo-Yuden-JMK316B7226ML-T_C2915243.pdf; ComponentLink2Description: JLCPCB Part URL; ComponentLink2URL: https://jlcpcb.com/partdetail/C2915243; ComponentLink3Description: LCSC Part URL; ComponentLink3URL: https://lcsc.com/product-detail/Multilayer-Ceramic-Capacitors-MLCC---SMD-SMT_Taiyo-Yuden-Taiyo-Yuden-JMK316B7226ML-T_C2915243.html
footprint CAP-1206 (1206 (3216M) Capacitor)
pins: 1, 2

## JMK316BJ106ML-T
designator C?  Capacitance: 10uF  (hidden comment: *)
Capacitor, Ceramic (MLCC), 10uF, ±20%, 6.3V, X5R, ±20%, SMD 1206; Manufacturer: Taiyo Yuden; Manufacturer Part Number: JMK316BJ106ML-T; Package Size: 1206; JLCPCB Basic Part: No; JLCPCB Part Number: C92790; Supplier 1: LCSC; Category: Capacitors - MLCC; Supplier Part Number 1: C92790; Tolerance: ±20%; Voltage Rating: 6.3V; Temperature Coefficient: X5R; RoHS: Yes; ComponentLink1Description: Datasheet; ComponentLink1URL: https://wmsc.lcsc.com/wmsc/upload/file/pdf/v2/lcsc/1810171733_Taiyo-Yuden-JMK316BJ106ML-T_C92790.pdf; ComponentLink2Description: JLCPCB Part URL; ComponentLink2URL: https://jlcpcb.com/partdetail/C92790; ComponentLink3Description: LCSC Part URL; ComponentLink3URL: https://lcsc.com/product-detail/Multilayer-Ceramic-Capacitors-MLCC---SMD-SMT_Taiyo-Yuden-Taiyo-Yuden-JMK316BJ106ML-T_C92790.html
footprint CAP-1206 (1206 (3216M) Capacitor)
pins: 1, 2

## JMK316BJ107ML-T
designator C?  Capacitance: 100uF  (hidden comment: *)
Capacitor, Ceramic (MLCC), 100uF, ±20%, 6.3V, X5R, ±20%, SMD 1206; Manufacturer: Taiyo Yuden; Manufacturer Part Number: JMK316BJ107ML-T; Package Size: 1206; JLCPCB Basic Part: No; JLCPCB Part Number: C87164; Supplier 1: LCSC; Category: Capacitors - MLCC; Supplier Part Number 1: C87164; Tolerance: ±20%; Voltage Rating: 6.3V; Temperature Coefficient: X5R; RoHS: Yes; ComponentLink1Description: Datasheet; ComponentLink1URL: https://wmsc.lcsc.com/wmsc/upload/file/pdf/v2/lcsc/2211282300_Taiyo-Yuden-JMK316BJ107ML-T_C87164.pdf; ComponentLink2Description: JLCPCB Part URL; ComponentLink2URL: https://jlcpcb.com/partdetail/C87164; ComponentLink3Description: LCSC Part URL; ComponentLink3URL: https://lcsc.com/product-detail/Multilayer-Ceramic-Capacitors-MLCC---SMD-SMT_Taiyo-Yuden-Taiyo-Yuden-JMK316BJ107ML-T_C87164.html
footprint CAP-1206 (1206 (3216M) Capacitor)
pins: 1, 2

## JMK316BJ226KL-T
designator C?  Capacitance: 22uF  (hidden comment: *)
Capacitor, Ceramic (MLCC), 22uF, ±10%, 6.3V, X5R, ±10%, SMD 1206; Manufacturer: Taiyo Yuden; Manufacturer Part Number: JMK316BJ226KL-T; Package Size: 1206; JLCPCB Basic Part: No; JLCPCB Part Number: C92791; Supplier 1: LCSC; Category: Capacitors - MLCC; Supplier Part Number 1: C92791; Tolerance: ±10%; Voltage Rating: 6.3V; Temperature Coefficient: X5R; RoHS: Yes; ComponentLink1Description: Datasheet; ComponentLink1URL: https://wmsc.lcsc.com/wmsc/upload/file/pdf/v2/lcsc/2211282300_Taiyo-Yuden-JMK316BJ226KL-T_C92791.pdf; ComponentLink2Description: JLCPCB Part URL; ComponentLink2URL: https://jlcpcb.com/partdetail/C92791; ComponentLink3Description: LCSC Part URL; ComponentLink3URL: https://lcsc.com/product-detail/Multilayer-Ceramic-Capacitors-MLCC---SMD-SMT_Taiyo-Yuden-Taiyo-Yuden-JMK316BJ226KL-T_C92791.html
footprint CAP-1206 (1206 (3216M) Capacitor)
pins: 1, 2

## JMK316BJ226ML-T
designator C?  Capacitance: 22uF  (hidden comment: *)
Capacitor, Ceramic (MLCC), 22uF, ±20%, 6.3V, X5R, ±20%, SMD 1206; Manufacturer: Taiyo Yuden; Manufacturer Part Number: JMK316BJ226ML-T; Package Size: 1206; JLCPCB Basic Part: No; JLCPCB Part Number: C92792; Supplier 1: LCSC; Category: Capacitors - MLCC; Supplier Part Number 1: C92792; Tolerance: ±20%; Voltage Rating: 6.3V; Temperature Coefficient: X5R; RoHS: Yes; ComponentLink1Description: Datasheet; ComponentLink1URL: https://wmsc.lcsc.com/wmsc/upload/file/pdf/v2/lcsc/2211282300_Taiyo-Yuden-JMK316BJ226ML-T_C92792.pdf; ComponentLink2Description: JLCPCB Part URL; ComponentLink2URL: https://jlcpcb.com/partdetail/C92792; ComponentLink3Description: LCSC Part URL; ComponentLink3URL: https://lcsc.com/product-detail/Multilayer-Ceramic-Capacitors-MLCC---SMD-SMT_Taiyo-Yuden-Taiyo-Yuden-JMK316BJ226ML-T_C92792.html
footprint CAP-1206 (1206 (3216M) Capacitor)
pins: 1, 2

## JMK316BJ476ML-T
designator C?  Capacitance: 47uF  (hidden comment: *)
Capacitor, Ceramic (MLCC), 47uF, ±20%, 6.3V, X5R, ±20%, SMD 1206; Manufacturer: Taiyo Yuden; Manufacturer Part Number: JMK316BJ476ML-T; Package Size: 1206; JLCPCB Basic Part: No; JLCPCB Part Number: C92793; Supplier 1: LCSC; Category: Capacitors - MLCC; Supplier Part Number 1: C92793; Tolerance: ±20%; Voltage Rating: 6.3V; Temperature Coefficient: X5R; RoHS: Yes; ComponentLink1Description: Datasheet; ComponentLink1URL: https://wmsc.lcsc.com/wmsc/upload/file/pdf/v2/lcsc/2211282300_Taiyo-Yuden-JMK316BJ476ML-T_C92793.pdf; ComponentLink2Description: JLCPCB Part URL; ComponentLink2URL: https://jlcpcb.com/partdetail/C92793; ComponentLink3Description: LCSC Part URL; ComponentLink3URL: https://lcsc.com/product-detail/Multilayer-Ceramic-Capacitors-MLCC---SMD-SMT_Taiyo-Yuden-Taiyo-Yuden-JMK316BJ476ML-T_C92793.html
footprint CAP-1206 (1206 (3216M) Capacitor)
pins: 1, 2

## KRM31KR71H225KH01L
designator C?  Capacitance: 2.2uF  (hidden comment: *)
Capacitor, Ceramic (MLCC), 2.2uF, ±10%, 50V, X7R, ±10%, SMD 1206; Manufacturer: Murata Electronics; Manufacturer Part Number: KRM31KR71H225KH01L; Package Size: 1206; JLCPCB Basic Part: No; JLCPCB Part Number: C162524; Supplier 1: LCSC; Category: Capacitors - MLCC; Supplier Part Number 1: C162524; Tolerance: ±10%; Voltage Rating: 50V; Temperature Coefficient: X7R; RoHS: Yes; ComponentLink1Description: Datasheet; ComponentLink1URL: https://wmsc.lcsc.com/wmsc/upload/file/pdf/v2/lcsc/2304140030_Murata-Electronics-KRM31KR71H225KH01L_C162524.pdf; ComponentLink2Description: JLCPCB Part URL; ComponentLink2URL: https://jlcpcb.com/partdetail/C162524; ComponentLink3Description: LCSC Part URL; ComponentLink3URL: https://lcsc.com/product-detail/Multilayer-Ceramic-Capacitors-MLCC---SMD-SMT_Murata-Electronics-Murata-Electronics-KRM31KR71H225KH01L_C162524.html
footprint CAP-1206 (1206 (3216M) Capacitor)
pins: 1, 2

## LMJ316BB7226KLHT
designator C?  Capacitance: 22uF  (hidden comment: *)
Capacitor, Ceramic (MLCC), 22uF, ±10%, 10V, X7R, ±10%, SMD 1206; Manufacturer: Taiyo Yuden; Manufacturer Part Number: LMJ316BB7226KLHT; Package Size: 1206; JLCPCB Basic Part: No; JLCPCB Part Number: C524990; Supplier 1: LCSC; Category: Capacitors - MLCC; Supplier Part Number 1: C524990; Tolerance: ±10%; Voltage Rating: 10V; Temperature Coefficient: X7R; RoHS: Yes; ComponentLink1Description: Datasheet; ComponentLink1URL: https://wmsc.lcsc.com/wmsc/upload/file/pdf/v2/lcsc/2006241834_Taiyo-Yuden-LMJ316BB7226KLHT_C524990.pdf; ComponentLink2Description: JLCPCB Part URL; ComponentLink2URL: https://jlcpcb.com/partdetail/C524990; ComponentLink3Description: LCSC Part URL; ComponentLink3URL: https://lcsc.com/product-detail/Multilayer-Ceramic-Capacitors-MLCC---SMD-SMT_Taiyo-Yuden-Taiyo-Yuden-LMJ316BB7226KLHT_C524990.html
footprint CAP-1206 (1206 (3216M) Capacitor)
pins: 1, 2

## LMK316AB7226KL-TR
designator C?  Capacitance: 22uF  (hidden comment: *)
Capacitor, Ceramic (MLCC), 22uF, ±10%, 10V, X7R, ±10%, SMD 1206; Manufacturer: Taiyo Yuden; Manufacturer Part Number: LMK316AB7226KL-TR; Package Size: 1206; JLCPCB Basic Part: No; JLCPCB Part Number: C386064; Supplier 1: LCSC; Category: Capacitors - MLCC; Supplier Part Number 1: C386064; Tolerance: ±10%; Voltage Rating: 10V; Temperature Coefficient: X7R; RoHS: Yes; ComponentLink1Description: Datasheet; ComponentLink1URL: https://wmsc.lcsc.com/wmsc/upload/file/pdf/v2/lcsc/2211282230_Taiyo-Yuden-LMK316AB7226KL-TR_C386064.pdf; ComponentLink2Description: JLCPCB Part URL; ComponentLink2URL: https://jlcpcb.com/partdetail/C386064; ComponentLink3Description: LCSC Part URL; ComponentLink3URL: https://lcsc.com/product-detail/Multilayer-Ceramic-Capacitors-MLCC---SMD-SMT_Taiyo-Yuden-Taiyo-Yuden-LMK316AB7226KL-TR_C386064.html
footprint CAP-1206 (1206 (3216M) Capacitor)
pins: 1, 2

## LMK316AB7226ML-TR
designator C?  Capacitance: 22uF  (hidden comment: *)
Capacitor, Ceramic (MLCC), 22uF, ±20%, 10V, X7R, ±20%, SMD 1206; Manufacturer: Taiyo Yuden; Manufacturer Part Number: LMK316AB7226ML-TR; Package Size: 1206; JLCPCB Basic Part: No; JLCPCB Part Number: C651007; Supplier 1: LCSC; Category: Capacitors - MLCC; Supplier Part Number 1: C651007; Tolerance: ±20%; Voltage Rating: 10V; Temperature Coefficient: X7R; RoHS: Yes; ComponentLink1Description: Datasheet; ComponentLink1URL: https://wmsc.lcsc.com/wmsc/upload/file/pdf/v2/lcsc/2211282200_Taiyo-Yuden-LMK316AB7226ML-TR_C651007.pdf; ComponentLink2Description: JLCPCB Part URL; ComponentLink2URL: https://jlcpcb.com/partdetail/C651007; ComponentLink3Description: LCSC Part URL; ComponentLink3URL: https://lcsc.com/product-detail/Multilayer-Ceramic-Capacitors-MLCC---SMD-SMT_Taiyo-Yuden-Taiyo-Yuden-LMK316AB7226ML-TR_C651007.html
footprint CAP-1206 (1206 (3216M) Capacitor)
pins: 1, 2
